# Altium footprint library mypcblib.PcbLib: 124 footprints (part 6 of 8)
Each footprint in its own frame and in the unit in brackets; x right, y up, seen from the top. Pads: shape width x height; smd on the part's side, far side on the other; paste and mask are expansions set on the pad; w line width, h text height; cw(c..) or ccw(c..) is an arc to the next point about the centre after c.
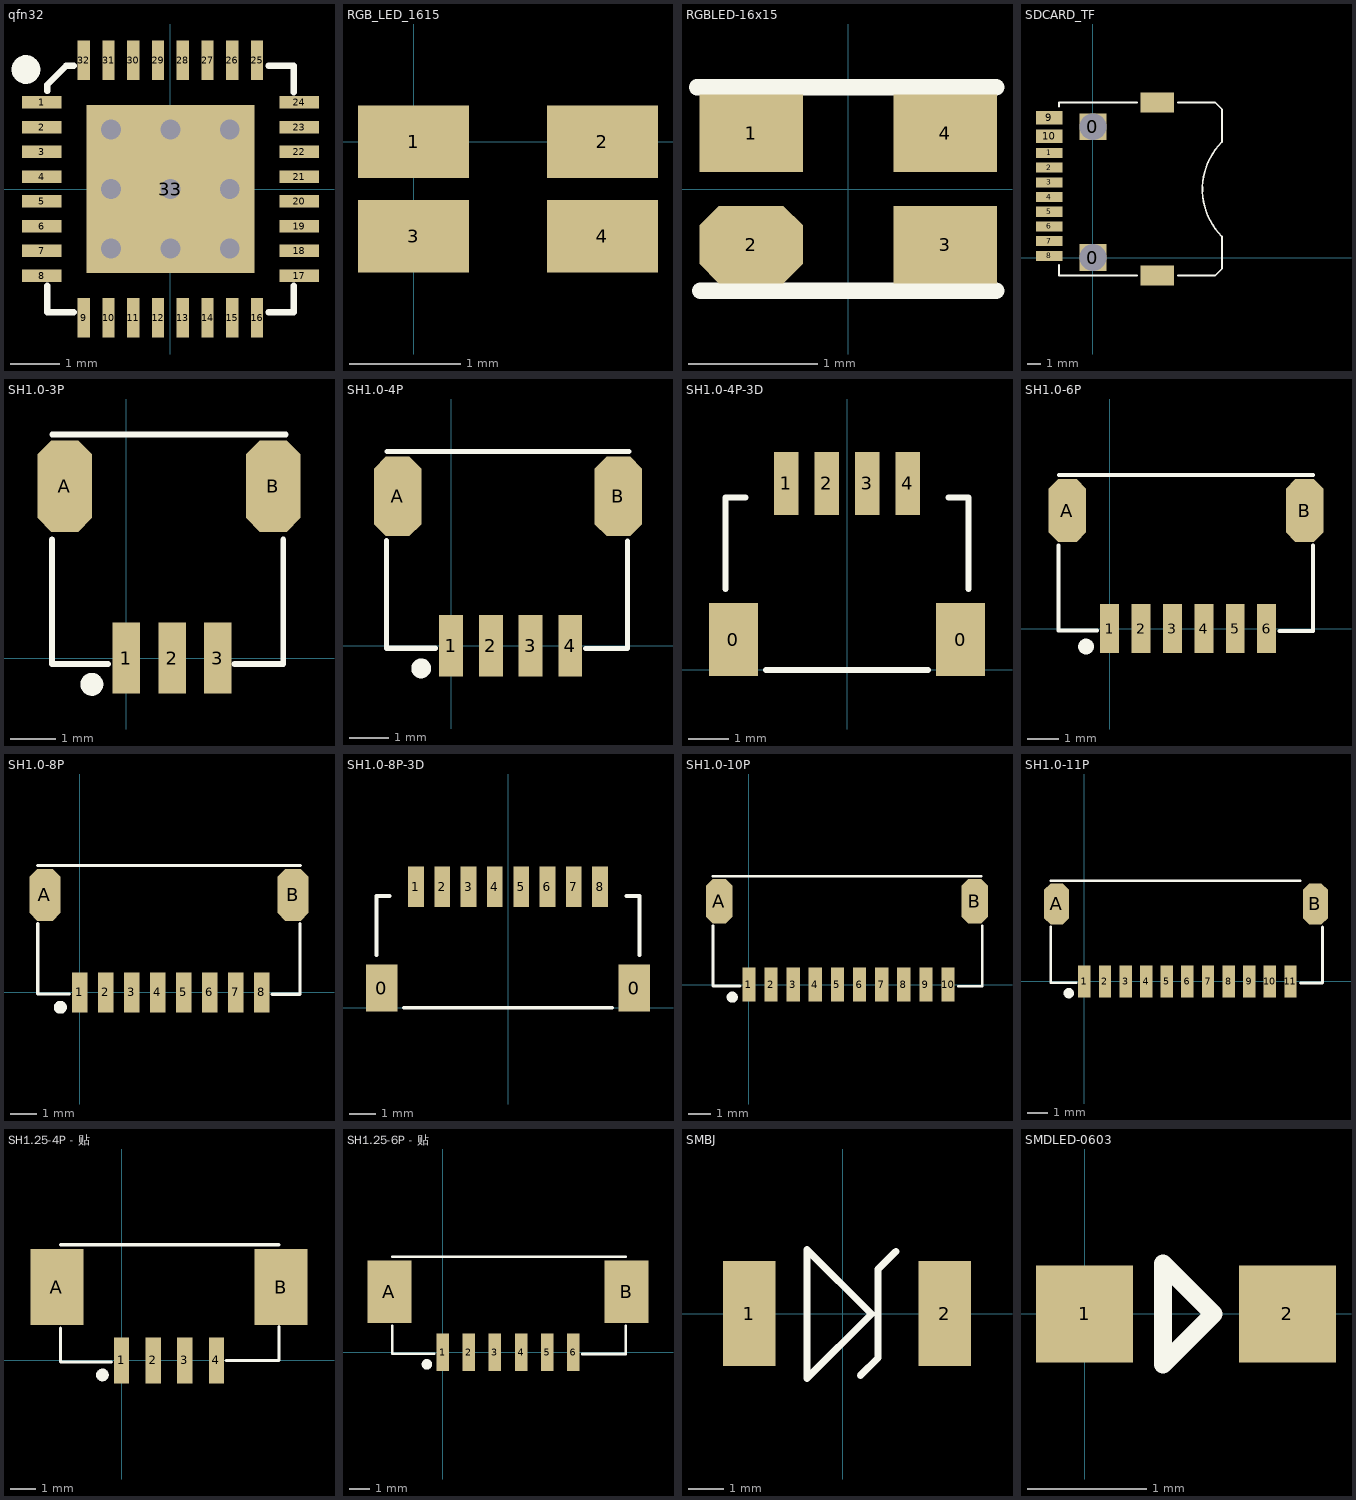
[diagram p5: the footprints below, top view; thin cyan lines are the x and y axes]

## qfn32 [mm]
pads (33):
  rect 0.8x0.25 smd: 1(-2.601,1.75) 2(-2.601,1.25) 3(-2.601,0.75) 4(-2.601,0.25) 5(-2.601,-0.25) 6(-2.601,-0.75) 7(-2.601,-1.25) 8(-2.601,-1.75) 17(2.601,-1.75) 18(2.601,-1.25) 19(2.601,-0.75) 20(2.601,-0.25) 21(2.601,0.25) 22(2.601,0.75) 23(2.601,1.25) 24(2.601,1.75)
  rect 0.25x0.8 smd: 9(-1.75,-2.601) 10(-1.25,-2.601) 11(-0.75,-2.601) 12(-0.25,-2.601) 13(0.25,-2.601) 14(0.75,-2.601) 15(1.25,-2.601) 16(1.75,-2.601) 25(1.75,2.601) 26(1.25,2.601) 27(0.75,2.601) 28(0.25,2.601) 29(-0.25,2.601) 30(-0.75,2.601) 31(-1.25,2.601) 32(-1.75,2.601)
  rect 3.4x3.4 smd: 33(0,0)
via -1.2,1.2 diameter 0.7 hole 0.4
via 0,1.2 diameter 0.7 hole 0.4
via 1.2,1.2 diameter 0.7 hole 0.4
via -1.2,0 diameter 0.7 hole 0.4
via 0,0 diameter 0.7 hole 0.4
via 1.2,0 diameter 0.7 hole 0.4
via -1.2,-1.2 diameter 0.7 hole 0.4
via 0,-1.2 diameter 0.7 hole 0.4
via 1.2,-1.2 diameter 0.7 hole 0.4
Top Overlay:
  circle w0.3: c-2.919,2.413 r0.14
  lines w0.127: -2.489,-1.956 -2.489,-2.489 -1.956,-2.489 ; -2.489,1.981 -2.489,2.108 -2.108,2.489 -1.956,2.489 ; 1.981,-2.489 2.489,-2.489 2.489,-1.956 ; 1.981,2.489 2.489,2.489 2.489,1.956
Mechanical 15:
  lines w0.1: -0.5,0 0.5,0 ; 0,-0.5 0,0.5

## RGB_LED_1615 [mm]
pads (4):
  rect 1x0.65 smd: 1(0,0) 2(1.7,0) 3(0,-0.85) 4(1.7,-0.85)

## RGBLED-16x15 [mm] "RGBLED  16x15"
pads (4):
  rect 0.8x0.6 smd: 1(-0.75,0.43) 3(0.75,-0.43) 4(0.75,0.43)
  oct 0.8x0.6 smd: 2(-0.75,-0.43)
Top Overlay:
  lines w0.127: -1.168,0.787 1.143,0.787 ; -1.143,-0.787 1.143,-0.787

## SDCARD_TF [mm] "TFCARD"
height 1
pads (14):
  rect 2x2 hole 2: 0(0,-0.002) 0(0,9.777)
  rect 2x0.75 smd: 1(-3.26,7.827) 2(-3.26,6.727) 3(-3.26,5.627) 4(-3.26,4.527) 5(-3.26,3.427) 6(-3.26,2.327) 7(-3.26,1.227) 8(-3.26,0.127)
  rect 2x1 smd: 9(-3.26,10.463) 10(-3.26,9.079)
  rect 2.5x1.5 smd: ""(4.826,-1.348) ""(4.826,11.606)
Top Overlay:
  lines w0.127: -2.54,-1.348 3.302,-1.348 ; -2.54,11.301 -2.54,11.606 3.302,11.606 ; -2.535,-1.348 -2.535,-0.548 ; 6.35,-1.348 9.144,-1.348 9.652,-0.84 9.652,1.319 9.652,1.573 cw(c13.188,5.109) 9.652,8.644 9.652,11.098 9.144,11.606 6.35,11.606

## SH1.0-3P [mm]
pads (5):
  rect 0.6x1.55 smd: 1(0,0) 2(1,0) 3(2,0)
  oct 1.2x2 smd: A(-1.346,3.759) B(3.21,3.759)
Top Overlay:
  circle w0.25: c-0.754,-0.573 r0.125
  lines w0.127: -1.626,2.591 -1.626,-0.127 -0.4,-0.127 ; -1.62,4.888 3.483,4.888 ; 2.362,-0.127 3.429,-0.127 3.429,2.591

## SH1.0-4P [mm]
pads (6):
  rect 0.6x1.55 smd: 1(0,0) 2(1,0) 3(2,0) 4(3,0)
  oct 1.2x2 smd: A(-1.346,3.759) B(4.21,3.759)
Top Overlay:
  circle w0.25: c-0.754,-0.573 r0.125
  lines w0.127: -1.626,2.653 -1.626,-0.065 -0.4,-0.065 ; -1.62,4.888 4.483,4.888 ; 3.378,-0.076 4.445,-0.076 4.445,2.642

## SH1.0-4P-3D [mm] "SH1.0-4P"
height 2.9
pads (6):
  rect 1.2x1.8 smd paste+0 mask+0.051: 0(-2.8,0.75) 0(2.8,0.75)
  rect 0.6x1.55 smd paste+0 mask+0.051: 1(-1.5,4.6) 2(-0.5,4.6) 3(0.5,4.6) 4(1.5,4.6)
Top Overlay:
  lines w0.15: -3,2 -3,4.25 -2.5,4.25 ; -2,0 2,0 ; 2.5,4.25 3,4.25 3,2
3D body "SM04B-SRSS-TB.STEP": height 2.92, standoff -0.04, extent -3,0 3,4.95

## SH1.0-6P [mm]
pads (8):
  rect 0.6x1.55 smd: 1(0,0) 2(1,0) 3(2,0) 4(3,0) 5(4,0) 6(5,0)
  oct 1.2x2 smd: A(-1.346,3.759) B(6.21,3.759)
Top Overlay:
  circle w0.25: c-0.754,-0.573 r0.125
  lines w0.127: -1.626,2.653 -1.626,-0.065 -0.4,-0.065 ; -1.62,4.888 6.483,4.888 ; 5.41,-0.076 6.477,-0.076 6.477,2.642

## SH1.0-8P [mm]
pads (10):
  rect 0.6x1.55 smd: 1(0,0) 2(1,0) 3(2,0) 4(3,0) 5(4,0) 6(5,0) 7(6,0) 8(7,0)
  oct 1.2x2 smd: A(-1.346,3.759) B(8.21,3.759)
Top Overlay:
  circle w0.25: c-0.754,-0.573 r0.125
  lines w0.127: -1.626,2.653 -1.626,-0.065 -0.4,-0.065 ; -1.62,4.888 8.483,4.888 ; 7.41,-0.076 8.477,-0.076 8.477,2.642

## SH1.0-8P-3D [mm] "SH1.0-8P"
height 2.95
pads (10):
  rect 1.2x1.8 smd paste+0 mask+0.051: 0(-4.8,0.75) 0(4.8,0.75)
  rect 0.6x1.55 smd paste+0 mask+0.051: 1(-3.5,4.6) 2(-2.5,4.6) 3(-1.5,4.6) 4(-0.5,4.6) 5(0.5,4.6) 6(1.5,4.6) 7(2.5,4.6) 8(3.5,4.6)
Top Overlay:
  lines w0.15: -5,2 -5,4.25 -4.5,4.25 ; -3.95,0 3.95,0 ; 4.5,4.25 5,4.25 5,2
3D body "SM08B-SRSS-TB.STEP": height 2.92, standoff -0.04, extent -5,0 5,4.95

## SH1.0-10P [mm]
pads (12):
  rect 0.6x1.55 smd: 1(0,0) 2(1,0) 3(2,0) 4(3,0) 5(4,0) 6(5,0) 7(6,0) 8(7,0) 9(8,0) 10(9,0)
  oct 1.2x2 smd: A(-1.346,3.759) B(10.21,3.759)
Top Overlay:
  circle w0.25: c-0.754,-0.573 r0.125
  lines w0.127: -1.626,2.653 -1.626,-0.065 -0.4,-0.065 ; -1.62,4.888 10.483,4.888 ; 9.474,-0.076 10.541,-0.076 10.541,2.642

## SH1.0-11P [mm]
pads (13):
  rect 0.6x1.55 smd: 1(0,0) 2(1,0) 3(2,0) 4(3,0) 5(4,0) 6(5,0) 7(6,0) 8(7,0) 9(8,0) 10(9,0) 11(10,0)
  oct 1.2x2 smd: A(-1.346,3.759) B(11.21,3.759)
Top Overlay:
  circle w0.25: c-0.754,-0.573 r0.125
  lines w0.127: -1.626,2.653 -1.626,-0.065 -0.4,-0.065 ; -1.62,4.888 10.483,4.888 ; 10.49,-0.076 11.557,-0.076 11.557,2.642

## SH1.25-4P - 贴 [mm]
pads (6):
  rect 0.6x1.8 smd: 1(0,0) 2(1.25,0) 3(2.5,0) 4(3.75,0)
  rect 2.1x3 smd: A(-2.55,2.9) B(6.3,2.9)
Top Overlay:
  circle w0.25: c-0.754,-0.573 r0.125
  lines w0.127: -2.413,1.27 -2.413,-0.065 -0.4,-0.065 ; -2.413,4.572 6.223,4.572 ; 4.14,0 6.223,0 6.223,1.346

## SH1.25-6P - 贴 [mm]
pads (8):
  rect 0.6x1.8 smd: 1(0,0) 2(1.25,0) 3(2.5,0) 4(3.75,0) 5(5,0) 6(6.25,0)
  rect 2.1x3 smd: A(-2.55,2.9) B(8.8,2.9)
Top Overlay:
  circle w0.25: c-0.754,-0.573 r0.125
  lines w0.127: -2.413,1.27 -2.413,-0.065 -0.4,-0.065 ; -2.413,4.572 8.763,4.572 ; 6.68,-0.076 8.763,-0.076 8.763,1.27

## SMBJ [mm] "3.9*5.6"
height 2
pads (2):
  rect 1.5x3 smd: 1(-2.667,0) 2(2.921,0)
Top Overlay:
  lines w0.203: 0.508,-1.778 1.016,-1.27 1.016,1.27 1.524,1.778 ; -1.016,-1.854 0.826,-0.013 -1.016,1.829 -1.016,-1.854

## SMDLED-0603 [mil]
pads (2):
  rect 32x32 smd: 1(0,0) 2(66.93,0)
Top Overlay:
  lines w6: 25.91,-16.61 25.91,-0.04 25.91,16.54 42.48,-0.04 25.91,-16.61